# Altium footprint library 集大电协1.2.PcbLib: 175 footprints (part 9 of 11)
Each footprint in its own frame and in the unit in brackets; x right, y up, seen from the top. Pads: shape width x height; smd on the part's side, far side on the other; paste and mask are expansions set on the pad; w line width, h text height; cw(c..) or ccw(c..) is an arc to the next point about the centre after c.
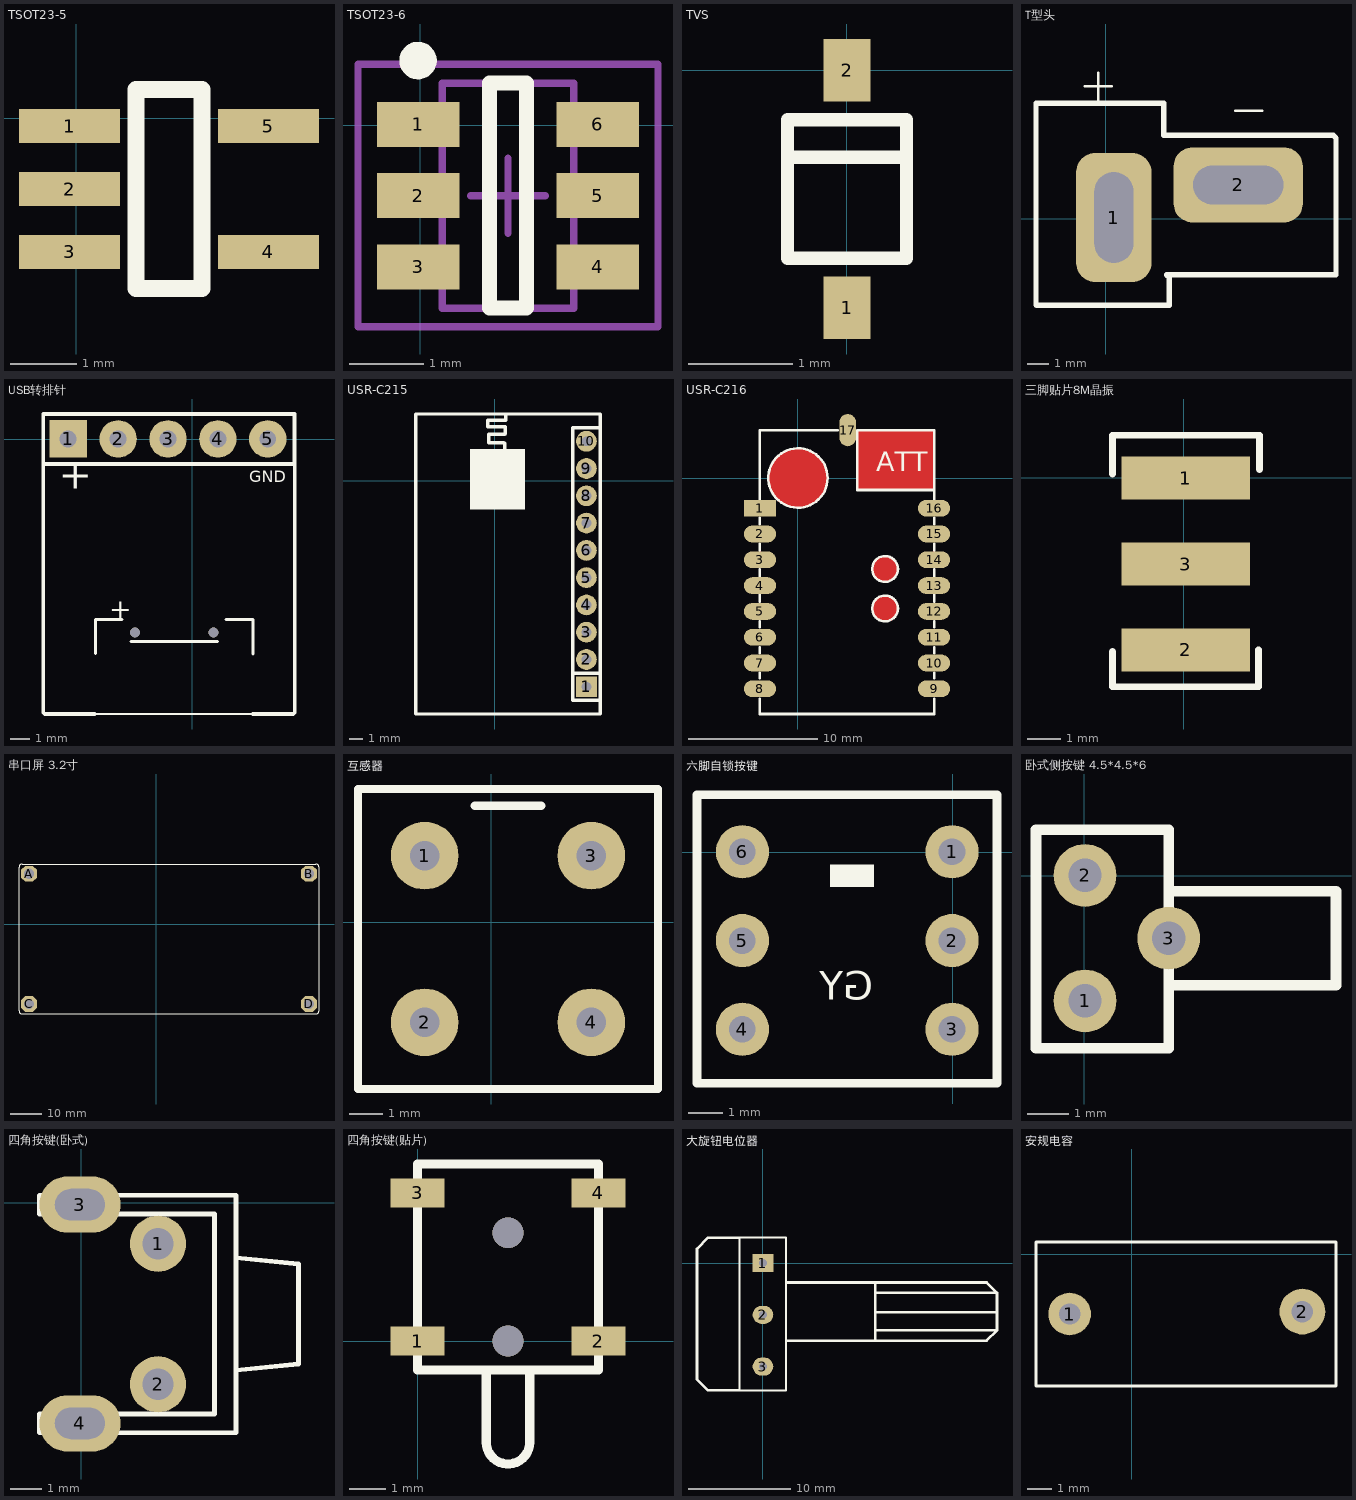
[diagram p8: the footprints below, top view; thin cyan lines are the x and y axes]

## TSOT23-5 [mil]
pads (5):
  rect 60x20 smd: 1(-4.06,-4.53) 2(-4.06,-41.93) 3(-4.06,-79.33) 4(114.06,-79.33) 5(114.06,-4.53)
Top Overlay:
  lines w10: 35.31,-100.98 35.31,17.13 74.69,17.13 74.69,-100.98 35.31,-100.98
3D body: height 47.24, standoff 0, extent 1,-98.09 111.23,16.09

## TSOT23-6 [mm]
pads (6):
  rect 1.1x0.6 smd: 1(-0.032,0.01) 2(-0.032,-0.94) 3(-0.032,-1.89) 4(2.368,-1.89) 5(2.368,-0.94) 6(2.368,0.01)
Top Overlay:
  circle w0.25: c-0.032,0.86 r0.125
  lines w0.2: 0.918,-2.44 0.918,0.56 1.418,0.56 1.418,-2.44 0.918,-2.44
Mechanical 13:
  lines w0.1: 0.293,-2.44 2.043,-2.44 2.043,0.56 0.293,0.56 0.293,-2.44
Mechanical 15:
  lines w0.1: 0.668,-0.94 1.668,-0.94 ; 1.168,-1.44 1.168,-0.44 ; -0.832,-2.69 3.168,-2.69 3.168,0.81 -0.832,0.81 -0.832,-2.69
3D body: height 1.45, standoff 0, extent 0.293,-2.44 2.043,0.56

## TVS [mm]
pads (2):
  rect 0.45x0.6 smd: 1(0.003,-2.286) 2(0.003,0)
Top Overlay:
  lines w0.127: -0.555,-0.838 0.562,-0.838 ; -0.57,-1.809 -0.57,-0.477 0.576,-0.477 0.576,-1.809 -0.57,-1.809
3D body "SOD-323.STEP": height 1, standoff 0, extent -0.65,-2.45 0.65,0.15

## T型头 [mm]
pads (2):
  rrect50% 3.5x6 hole 1.8 slot 4.2 at 90 deg: 1(0.373,0.053)
  rrect50% 6x3.5 hole 1.8 slot 4.2 at 0 deg: 2(6.157,1.566)
Top Overlay:
  lines w0.1: -0.986,6.154 0.284,6.154 ; -0.351,5.519 -0.351,6.789 ; 5.999,5.011 7.269,5.011
  lines w0.254: -3.243,-4.006 -3.243,5.366 2.697,5.366 2.697,3.868 10.571,3.868 10.698,3.741 10.698,-2.609 2.824,-2.609 2.951,-2.736 2.951,-4.034 -3.215,-4.034 -3.243,-4.006
3D body "User Library-Deans.step": height 14.1, standoff -4.9, extent -2.665,-3.157 9.335,4.143

## USB转排针 [mm]
pads (7):
  rect 1.905x1.905 hole 0.864: 1(-6.316,0.014)
  round 1.905 hole 0.864: 2(-3.776,0.014) 3(-1.236,0.014) 4(1.304,0.014) 5(3.839,0.014)
  round 0.5 hole 0.5 unplated: ""(-2.923,-9.834) ""(1.077,-9.834)
Top Overlay:
  lines w0.1: -4.973,-13.984 3.077,-13.984
  lines w0.152: -4.923,-10.9 -4.923,-9.184 -3.573,-9.184 ; -3.123,-10.284 1.277,-10.284 ; 1.727,-9.184 3.077,-9.184 3.077,-10.934
  lines w0.2: -4.973,-13.984 -7.502,-13.984 -7.586,-13.9 -7.586,-1.256 ; 3.077,-13.984 5.13,-13.984 ; 5.214,-13.9 5.214,-1.256 ; -7.586,-1.256 5.2,-1.256 5.2,1.284 -7.586,1.284 -7.586,-1.256
  text "GND" at 2.9,-2.4 h1.02
  text "+" at -4.223,-9.134 h1
  text "+" at -6.8,-3 h2.54
3D body "MICRO-USB.stp": height 2.47, standoff -0.92, extent -4.875,-14.1 3.075,-8.324
3D body "HDR1X5_2.54mm.STEP": height 8.54, standoff -3, extent -7.591,-1.256 5.109,1.284

## USR-C215 [mil]
pads (10):
  rect 60x60 hole 28: 1(264.14,-593.99)
  round 60 hole 28: 2(264.14,-515.25) 3(264.14,-436.51) 4(264.14,-357.77) 5(264.14,-279.03) 6(264.14,-200.29) 7(264.14,-121.55) 8(264.14,-42.81) 9(264.14,35.93) 10(264.14,114.67)
Top Overlay:
  circle w10: c16.75,46.74 r32.8
  rectangle: -71.86,-81.99 86.14,92.01
  lines w10: 27.75,80.74 27.75,108.74 25.75,110.74 -18.25,110.74 -18.25,134.74 28.75,134.74 29.75,135.74 29.75,156.74 -20.25,156.74 -20.25,174.74 31.75,174.74 31.75,190.74 ; 224.77,-554.62 303.51,-554.62 ; -227.99,-672.73 -227.99,193.41 303.51,193.41 303.51,-672.73 -227.99,-672.73 ; 224.77,-633.36 224.77,154.04 303.51,154.04 303.51,-633.36 224.77,-633.36
3D body: height 30, standoff 0, extent -227,-672 303,193
3D body: height 40, standoff 30, extent -72,-83 85,90
3D body: height 40, standoff 10, extent -22.25,9.74 53.75,84.74

## USR-C216 [mm] "有人公司WIFI模组 USR-C216"
pads (17):
  rect 2.5x1.3 smd: 1(-2.945,-2.325)
  oval 2.5x1.3 smd: 2(-2.945,-4.325) 3(-2.945,-6.325) 4(-2.945,-8.325) 5(-2.945,-10.325) 6(-2.945,-12.325) 7(-2.945,-14.325) 8(-2.945,-16.325) 9(10.555,-16.325) 10(10.555,-14.325) 11(10.555,-12.325) 12(10.555,-10.325) 13(10.555,-8.325) 14(10.555,-6.325) 15(10.555,-4.325) 16(10.555,-2.325)
  oval 1.3x2.5 smd: 17(3.855,3.725)
Top Layer:
  pour cut-out: 0.015,2.305 0.241,2.305 0.683,2.217 1.1,2.044 1.475,1.794 1.794,1.475 2.044,1.1 2.217,0.683 2.305,0.241 2.305,0.015 2.305,-0.212 2.217,-0.656 2.043,-1.074 1.792,-1.451 1.471,-1.772 1.094,-2.023 0.676,-2.197 0.232,-2.285 0.005,-2.285 -0.015,-2.285 -0.241,-2.285 -0.683,-2.197 -1.1,-2.024 -1.475,-1.774 -1.794,-1.455 -2.044,-1.08 -2.217,-0.663 -2.305,-0.221 -2.305,0.005 -2.305,0.025 -2.305,0.25 -2.217,0.69 -2.046,1.105 -1.796,1.478 -1.478,1.796 -1.105,2.046 -0.69,2.217 -0.25,2.305 -0.025,2.305
  pour cut-out: 4.611,3.725 4.611,-0.905 10.555,-0.905 10.555,3.725
  pour cut-out: 6.755,-6.035 6.853,-6.035 7.047,-6.073 7.229,-6.149 7.392,-6.258 7.532,-6.398 7.641,-6.561 7.717,-6.743 7.755,-6.937 7.755,-7.035 7.755,-7.133 7.717,-7.327 7.641,-7.509 7.532,-7.672 7.392,-7.812 7.229,-7.921 7.047,-7.997 6.853,-8.035 6.755,-8.035 6.657,-8.035 6.463,-7.997 6.281,-7.921 6.118,-7.812 5.978,-7.672 5.869,-7.509 5.793,-7.327 5.755,-7.133 5.755,-7.035 5.755,-7.025 5.755,-6.927 5.793,-6.736 5.868,-6.556 5.976,-6.394 6.114,-6.256 6.276,-6.148 6.456,-6.073 6.647,-6.035 6.745,-6.035
  pour cut-out: 6.755,-9.085 6.853,-9.085 7.047,-9.123 7.229,-9.199 7.392,-9.308 7.532,-9.448 7.641,-9.611 7.717,-9.793 7.755,-9.987 7.755,-10.085 7.755,-10.105 7.755,-10.203 7.717,-10.397 7.641,-10.579 7.532,-10.742 7.392,-10.882 7.229,-10.991 7.047,-11.067 6.853,-11.105 6.755,-11.105 6.657,-11.105 6.463,-11.067 6.281,-10.991 6.118,-10.882 5.978,-10.742 5.869,-10.579 5.793,-10.397 5.755,-10.203 5.755,-10.105 5.755,-10.085 5.755,-9.987 5.793,-9.793 5.869,-9.611 5.978,-9.448 6.118,-9.308 6.281,-9.199 6.463,-9.123 6.657,-9.085
Top Overlay:
  circle w0.2: c0.005,0.015 r2.3
  circle w0.2: c6.755,-10.095 r1
  circle w0.2: c6.755,-7.035 r1
  lines w0.203: -2.945,-17.081 -2.945,-18.275 10.555,-18.275 10.555,-17.081 ; -2.945,-15.506 -2.945,-15.075 ; -2.945,-13.576 -2.945,-13.093 ; -2.945,-11.544 -2.945,-11.087 ; -2.945,-9.588 -2.945,-9.055 ; -2.945,-7.582 -2.945,-7.074 ; -2.945,-5.6 -2.945,-5.067 ; -2.945,-3.568 -2.945,-3.086 ; -2.945,-1.638 -2.945,3.725 3.087,3.725 ; 10.555,-15.506 10.555,-15.075 ; 10.555,-13.576 10.555,-13.093 ; 10.555,-11.544 10.555,-11.087 ; 10.555,-9.588 10.555,-9.055 ; 10.555,-7.582 10.555,-7.074 ; 10.555,-5.6 10.555,-5.067 ; 10.555,-3.568 10.555,-3.086 ; 10.555,-1.638 10.555,3.725 4.611,3.725 4.611,-0.915 10.555,-0.915
  text "ATT" at 6.059,0.525 h1.52
3D body: height 1, standoff 0, extent -3.035,-18.185 10.535,3.725

## 三脚贴片8M晶振 [mm] "CSTCC8M00G53-RO"
pads (3):
  rect 3.8x1.27 smd: 1(0.06,-0.006) 2(0.06,-5.086) 3(0.06,-2.546)
Top Overlay:
  lines w0.203: -2.099,-5.137 -2.099,-6.178 2.219,-6.178 2.219,-5.086 ; -2.099,0.121 -2.099,1.264 2.244,1.264 2.244,0.248
3D body: height 1.5, standoff 0.1, extent -1.718,-6.229 1.838,1.264

## 串口屏 3.2寸 [mm]
pads (4):
  oct 5x5 hole 3.2: A(-40.3,15.9) B(48.3,15.9) C(-40.3,-25.3) D(48.3,-25.3)
Top Overlay:
  lines w0.127: -43.5,-27.5 ccw(c-42.5,-27.5) -42.5,-28.5 50.5,-28.5 ccw(c50.5,-27.5) 51.5,-27.5 51.5,18 ccw(c50.5,18) 50.5,19 -42.5,19 ccw(c-42.5,18) -43.5,18 -43.5,-27.5

## 互感器 [mil]
pads (4):
  round 80 hole 35: 1(-78.74,78.74) 2(-78.74,-118.11) 3(118.11,78.74) 4(118.11,-118.11)
Top Overlay:
  lines w10: -19.68,137.8 59.06,137.8 ; -157.48,-196.85 196.85,-196.85 196.85,157.48 -157.48,157.48 -157.48,-196.85

## 六脚自锁按键 [mil]
pads (6):
  round 60 hole 30: 1(-0.63,0.71) 2(-0.63,-99.29) 3(-0.63,-199.29) 4(-236.85,-199.29) 5(-236.85,-99.29) 6(-236.85,0.71)
Top Overlay:
  region: -88.43,-13.66 -138.43,-13.66 -138.43,-38.66 -88.43,-38.66
  lines w10: -288,-260 50,-260 50,65 -288,65 -288,-260
  text "GY" at -89.21,-176.46 h55
3D body "TL 2201.step": height 551.18, standoff -137.8, extent -287.32,-266 47.32,68.64

## 卧式侧按键 4.5*4.5*6 [mm] "卧式侧按键 4.5*4.5*6"
pads (3):
  round 1.5 hole 0.8: 1(0.022,-2.992) 2(0.022,0.008) 3(2.022,-1.492)
Top Overlay:
  lines w0.254: 2.022,-2.617 6.022,-2.617 6.022,-0.367 2.022,-0.367 ; -1.15,-4.125 -1.15,1.1 2.022,1.1 2.022,-4.125 -1.15,-4.125

## 四角按键(卧式) [mm] "轻触开关 卧式带支架"
pads (4):
  round 1.8 hole 1: 1(2.452,-1.308) 2(2.452,-5.808)
  oval 2.6x1.8 hole 1 slot 1.6 at 0 deg: 3(-0.048,-0.058) 4(-0.048,-7.058)
Top Overlay:
  lines w0.16: 1.452,-7.358 4.952,-7.358 ; 4.952,-5.358 6.952,-5.158 6.952,-1.958 4.952,-1.758 ; 4.952,-7.358 -1.348,-7.358 -1.348,-6.758 4.252,-6.758 4.252,-0.358 -1.348,-0.358 -1.348,0.242 4.952,0.242 4.952,-7.358

## 四角按键(贴片) [mm]
pads (4):
  rect 1.5x0.8 smd: 1(0,0) 2(5,0) 3(0,4.1) 4(5,4.1)
via 2.5,0 diameter 0.85 hole 0.85
via 2.5,3 diameter 0.85 hole 0.85
Top Overlay:
  lines w0.254: 1.9,-0.8 1.9,-2.8 ccw(c2.5,-2.8) 3.1,-2.8 3.1,-0.8 ; 0,-0.8 5,-0.8 5,4.9 0,4.9 0,-0.8
3D body: height 2.5, standoff 0, extent -1.079,-1.243 6.121,5.257

## 大旋钮电位器 [mil]
pads (3):
  rect 80x70 hole 30: 1(0,0)
  oval 80x70 hole 30: 2(0,-200) 3(0,-400)
Top Overlay:
  lines w7.87: -90,-492.13 90,-492.13 90,98.43 -90,98.43 -90,-492.13
  lines w10: -90,-492.13 -212.87,-492.13 -255,-450 -255,55 -211.57,98.43 -90,98.43 ; 90,-300 825,-300 ; 90,-75 865,-75 905,-115 ; 435,-300 435,-75 ; 435,-260 905,-260 ; 435,-190 900,-190 ; 435,-115 905,-115 ; 815,-300 865,-300 905,-260 ; 905,-260 905,-115

## 安规电容 [mm]
pads (2):
  round 1.778 hole 0.889: 1(-2.6,-2.5)
  round 1.905 hole 0.889: 2(7.1,-2.4)
Top Overlay:
  lines w0.127: -4,-5.5 8.5,-5.5 8.5,0.5 -4,0.5 -4,-5.5
3D body "Capacitor 10n - 630V.step": height 10.92, standoff -3, extent -4.155,-4.976 8.595,-0.225